# Altium footprint library PcbLib1.PcbLib: 1009 footprints (part 3 of 64)
Each footprint in its own frame and in the unit in brackets; x right, y up, seen from the top. Pads: shape width x height; smd on the part's side, far side on the other; paste and mask are expansions set on the pad; w line width, h text height; cw(c..) or ccw(c..) is an arc to the next point about the centre after c.
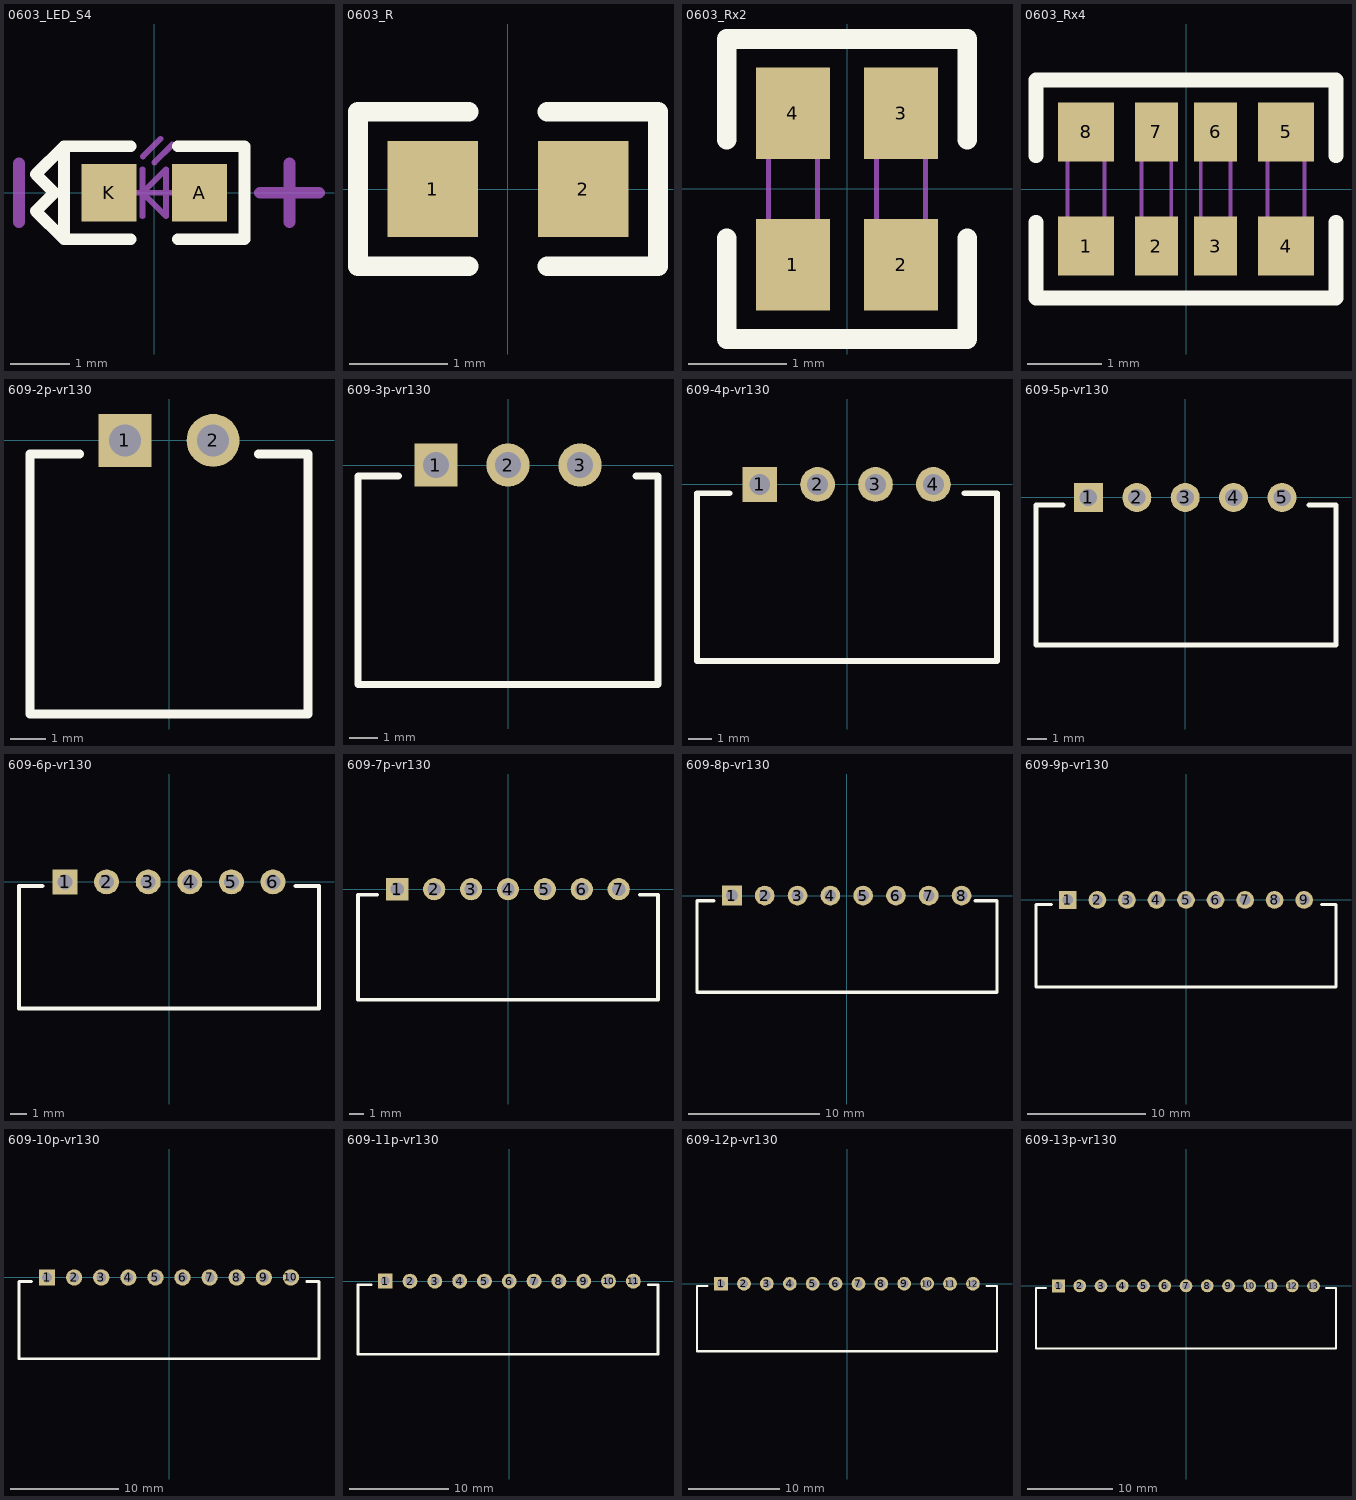
[diagram p2: the footprints below, top view; thin cyan lines are the x and y axes]

## 0603_LED_S4 [mm]
pads (2):
  rect 0.93x0.98 smd: A(0.77,0) K(-0.77,0)
Top Overlay:
  lines w0.2: -0.4,-0.79 -1.535,-0.79 ; -0.4,0.79 -1.535,0.79 ; 0.4,-0.79 1.535,-0.79 1.535,0.79 0.4,0.79 ; -1.535,-0.79 -2.012,-0.313 -1.7,0 -2.012,0.313 -1.535,0.79 ; -1.535,-0.79 -1.535,0.79
Mechanical 13:
  lines w0.1: -0.4,0 0.4,0 ; -0.2,-0.4 -0.2,0.4 ; -0.195,0.617 0.105,0.917 ; 0.005,0.517 0.305,0.817 ; -0.2,0 0.2,-0.4 0.2,0.4 -0.2,0
Mechanical 15:
  lines w0.203: -2.3,-0.5 -2.3,0.5 ; 1.8,0 2.8,0 ; 2.3,-0.5 2.3,0.5
3D body "User Library-LED_0603_R.STEP": height 0.6, standoff 0, extent -0.8,-0.4 0.8,0.4

## 0603_R [mm]
pads (2):
  rect 0.93x0.98 smd: 1(-0.77,0) 2(0.77,0)
Top Overlay:
  lines w0.2: -0.4,-0.79 -1.535,-0.79 -1.535,0.79 -0.4,0.79 ; 0.4,-0.79 1.535,-0.79 1.535,0.79 0.4,0.79
3D body "RES0603.STEP": height 0.45, standoff 0, extent -0.8,-0.41 0.8,0.41

## 0603_Rx2 [mm]
pads (4):
  rect 0.75x0.93 smd: 1(-0.55,-0.77) 2(0.55,-0.77) 3(0.55,0.77) 4(-0.55,0.77)
Top Overlay:
  lines w0.2: -1.225,-0.5 -1.225,-1.527 1.225,-1.527 1.225,-0.5 ; -1.225,0.5 -1.225,1.527 1.225,1.527 1.225,0.5
Mechanical 13:
  lines w0.05: -0.8,-0.8 -0.8,0.8 -0.3,0.8 -0.3,-0.8 -0.8,-0.8 ; 0.3,-0.8 0.3,0.8 0.8,0.8 0.8,-0.8 0.3,-0.8

## 0603_Rx4 [mm]
pads (8):
  rect 0.75x0.8 smd mask+0.051: 1(-1.35,-0.77) 4(1.35,-0.77) 5(1.35,0.77) 8(-1.35,0.77)
  rect 0.58x0.8 smd mask+0.051: 2(-0.4,-0.77) 3(0.4,-0.77) 6(0.4,0.77) 7(-0.4,0.77)
Top Overlay:
  lines w0.2: -2.025,-0.45 -2.025,-1.47 2.025,-1.47 2.025,-0.45 ; -2.025,0.45 -2.025,1.47 2.025,1.47 2.025,0.45
Mechanical 13:
  lines w0.05: -1.6,-0.8 -1.1,-0.8 -1.1,0.8 -1.6,0.8 -1.6,-0.8 ; -0.6,-0.8 -0.2,-0.8 -0.2,0.8 -0.6,0.8 -0.6,-0.8 ; 0.2,-0.8 0.6,-0.8 0.6,0.8 0.2,0.8 0.2,-0.8 ; 1.1,-0.8 1.6,-0.8 1.6,0.8 1.1,0.8 1.1,-0.8
3D body "8P4R-0603.STEP": height 0.6, standoff 0, extent -1.6,-0.775 1.6,0.825

## 609-2p-vr130 [mm]
height 11.7
pads (2):
  rect 1.5x1.5 hole 0.9: 1(-1.25,0)
  round 1.5 hole 0.9: 2(1.25,0)
Top Overlay:
  lines w0.254: -2.54,-0.381 -3.937,-0.381 -3.937,-7.747 3.937,-7.747 3.937,-0.381 2.54,-0.381
3D body "v150-090.stp": height 0.02, standoff -1.65, extent 0.5,-0.75 2,0.75
3D body "vf150-090.stp": height 0.01, standoff -1.65, extent -2,-0.75 -0.5,0.75
3D body "609-2p-vr130.stp": height 5.75, standoff -3.35, extent -3.75,-7.508 3.75,0.132

## 609-3p-vr130 [mm]
height 11.7
pads (3):
  rect 1.5x1.5 hole 0.9: 1(-2.5,0)
  round 1.5 hole 0.9: 2(0,0) 3(2.5,0)
Top Overlay:
  lines w0.254: -3.81,-0.381 -5.207,-0.381 -5.207,-7.62 5.207,-7.62 5.207,-0.381 4.445,-0.381
3D body "v150-090.stp": height 0.02, standoff -1.65, extent -0.75,-0.75 0.75,0.75
3D body "vf150-090.stp": height 0.01, standoff -1.65, extent -3.25,-0.75 -1.75,0.75
3D body "v150-090.stp": height 0.02, standoff -1.65, extent 1.75,-0.75 3.25,0.75
3D body "609-3p-vr130.stp": height 5.75, standoff -3.35, extent -5,-7.381 5,0.259

## 609-4p-vr130 [mm]
height 11.7
pads (4):
  rect 1.5x1.5 hole 0.9: 1(-3.77,0)
  round 1.5 hole 0.9: 2(-1.27,0) 3(1.23,0) 4(3.73,0)
Top Overlay:
  lines w0.254: -5.08,-0.381 -6.477,-0.381 -6.477,-7.62 6.477,-7.62 6.477,-0.381 5.08,-0.381
3D body "v150-090.stp": height 0.02, standoff -1.65, extent 0.48,-0.75 1.98,0.75
3D body "vf150-090.stp": height 0.01, standoff -1.65, extent -4.52,-0.75 -3.02,0.75
3D body "v150-090.stp": height 0.02, standoff -1.65, extent -2.02,-0.75 -0.52,0.75
3D body "v150-090.stp": height 0.02, standoff -1.65, extent 2.973,-0.75 4.473,0.75
3D body "609-4p-vr130.stp": height 5.75, standoff -3.35, extent -6.25,-7.381 6.25,0.259

## 609-5p-vr130 [mm]
height 11.7
pads (5):
  rect 1.5x1.5 hole 0.9: 1(-5,0)
  round 1.5 hole 0.9: 2(-2.5,0) 3(0,0) 4(2.5,0) 5(5,0)
Top Overlay:
  lines w0.254: -6.31,-0.381 -7.707,-0.381 -7.707,-7.62 7.787,-7.62 7.787,-0.381 6.39,-0.381
3D body "609-5p-vr130.stp": height 5.75, standoff -3.35, extent -7.46,-7.381 7.54,0.259
3D body "v150-090.stp": height 0.02, standoff -1.65, extent 4.25,-0.75 5.75,0.75
3D body "v150-090.stp": height 0.02, standoff -1.65, extent -0.75,-0.75 0.75,0.75
3D body "vf150-090.stp": height 0.01, standoff -1.65, extent -5.75,-0.75 -4.25,0.75
3D body "v150-090.stp": height 0.02, standoff -1.65, extent -3.25,-0.75 -1.75,0.75
3D body "v150-090.stp": height 0.02, standoff -1.65, extent 1.743,-0.75 3.243,0.75

## 609-6p-vr130 [mm]
height 11.7
pads (6):
  rect 1.5x1.5 hole 0.9: 1(-6.25,0)
  round 1.5 hole 0.9: 2(-3.75,0) 3(-1.25,0) 4(1.25,0) 5(3.75,0) 6(6.25,0)
Top Overlay:
  lines w0.254: -7.62,-0.254 -9.017,-0.254 -9.017,-7.62 9.017,-7.62 9.017,-0.254 7.62,-0.254
3D body "609-6p-vr130.stp": height 5.75, standoff -3.35, extent -8.75,-7.381 8.75,0.259
3D body "v150-090.stp": height 0.02, standoff -1.65, extent 5.5,-0.75 7,0.75
3D body "v150-090.stp": height 0.02, standoff -1.65, extent 0.493,-0.75 1.993,0.75
3D body "v150-090.stp": height 0.02, standoff -1.65, extent -4.5,-0.75 -3,0.75
3D body "vf150-090.stp": height 0.01, standoff -1.65, extent -7,-0.75 -5.5,0.75
3D body "v150-090.stp": height 0.02, standoff -1.65, extent -2,-0.75 -0.5,0.75
3D body "v150-090.stp": height 0.02, standoff -1.65, extent 3,-0.75 4.5,0.75

## 609-7p-vr130 [mm]
height 11.7
pads (7):
  rect 1.5x1.5 hole 0.9: 1(-7.5,0)
  round 1.5 hole 0.9: 2(-5,0) 3(-2.5,0) 4(0,0) 5(2.5,0) 6(5,0) 7(7.5,0)
Top Overlay:
  lines w0.254: -8.85,-0.381 -10.16,-0.381 -10.16,-7.493 10.16,-7.493 10.16,-0.381 8.93,-0.381
3D body "v150-090.stp": height 0.02, standoff -1.65, extent 6.75,-0.75 8.25,0.75
3D body "v150-090.stp": height 0.02, standoff -1.65, extent 1.75,-0.75 3.25,0.75
3D body "v150-090.stp": height 0.02, standoff -1.65, extent -3.25,-0.75 -1.75,0.75
3D body "vf150-090.stp": height 0.01, standoff -1.65, extent -8.25,-0.75 -6.75,0.75
3D body "v150-090.stp": height 0.02, standoff -1.65, extent -5.75,-0.75 -4.25,0.75
3D body "v150-090.stp": height 0.02, standoff -1.65, extent -0.757,-0.75 0.743,0.75
3D body "v150-090.stp": height 0.02, standoff -1.65, extent 4.25,-0.75 5.75,0.75
3D body "609-7p-vr130.stp": height 5.75, standoff -3.35, extent -10,-7.381 10,0.259

## 609-8p-vr130 [mm]
height 11.7
pads (8):
  rect 1.5x1.5 hole 0.9: 1(-8.75,0)
  round 1.5 hole 0.9: 2(-6.25,0) 3(-3.75,0) 4(-1.25,0) 5(1.25,0) 6(3.75,0) 7(6.25,0) 8(8.75,0)
Top Overlay:
  lines w0.254: -10.14,-0.381 -11.41,-0.381 -11.41,-7.366 11.45,-7.366 11.45,-0.381 9.799,-0.381
3D body "609-8p-vr130.stp": height 5.75, standoff -3.35, extent -11.23,-7.254 11.27,0.386
3D body "v150-090.stp": height 0.02, standoff -1.65, extent 8,-0.75 9.5,0.75
3D body "v150-090.stp": height 0.02, standoff -1.65, extent 3,-0.75 4.5,0.75
3D body "v150-090.stp": height 0.02, standoff -1.65, extent -2.007,-0.75 -0.507,0.75
3D body "v150-090.stp": height 0.02, standoff -1.65, extent -7,-0.75 -5.5,0.75
3D body "vf150-090.stp": height 0.01, standoff -1.65, extent -9.5,-0.75 -8,0.75
3D body "v150-090.stp": height 0.02, standoff -1.65, extent -4.5,-0.75 -3,0.75
3D body "v150-090.stp": height 0.02, standoff -1.65, extent 0.5,-0.75 2,0.75
3D body "v150-090.stp": height 0.02, standoff -1.65, extent 5.5,-0.75 7,0.75

## 609-9p-vr130 [mm]
height 11.7
pads (9):
  rect 1.5x1.5 hole 0.9: 1(-10,0)
  round 1.5 hole 0.9: 2(-7.5,0) 3(-5,0) 4(-2.5,0) 5(0,0) 6(2.5,0) 7(5,0) 8(7.5,0) 9(10,0)
Top Overlay:
  lines w0.254: -11.39,-0.381 -12.7,-0.381 -12.7,-7.366 12.7,-7.366 12.7,-0.381 11.47,-0.381
3D body "v150-090.stp": height 0.02, standoff -1.65, extent 4.25,-0.75 5.75,0.75
3D body "v150-090.stp": height 0.02, standoff -1.65, extent -0.75,-0.75 0.75,0.75
3D body "v150-090.stp": height 0.02, standoff -1.65, extent -5.75,-0.75 -4.25,0.75
3D body "vf150-090.stp": height 0.01, standoff -1.65, extent -10.75,-0.75 -9.25,0.75
3D body "v150-090.stp": height 0.02, standoff -1.65, extent -8.25,-0.75 -6.75,0.75
3D body "v150-090.stp": height 0.02, standoff -1.65, extent -3.257,-0.75 -1.757,0.75
3D body "v150-090.stp": height 0.02, standoff -1.65, extent 1.75,-0.75 3.25,0.75
3D body "v150-090.stp": height 0.02, standoff -1.65, extent 6.75,-0.75 8.25,0.75
3D body "v150-090.stp": height 0.02, standoff -1.65, extent 9.25,-0.75 10.75,0.75
3D body "609-9p-vr130.stp": height 5.75, standoff -3.35, extent -12.5,-7.254 12.5,0.386

## 609-10p-vr130 [mm]
height 11.7
pads (10):
  rect 1.5x1.5 hole 0.9: 1(-11.25,0)
  round 1.5 hole 0.9: 2(-8.75,0) 3(-6.25,0) 4(-3.75,0) 5(-1.25,0) 6(1.25,0) 7(3.75,0) 8(6.25,0) 9(8.75,0) 10(11.25,0)
Top Overlay:
  lines w0.254: -12.68,-0.381 -13.843,-0.381 -13.843,-7.493 13.843,-7.493 13.843,-0.381 12.72,-0.381
3D body "609-10p-vr130.stp": height 5.75, standoff -3.35, extent -13.73,-7.381 13.77,0.259
3D body "v150-090.stp": height 0.02, standoff -1.65, extent 10.5,-0.75 12,0.75
3D body "v150-090.stp": height 0.02, standoff -1.65, extent 8,-0.75 9.5,0.75
3D body "v150-090.stp": height 0.02, standoff -1.65, extent 5.5,-0.75 7,0.75
3D body "v150-090.stp": height 0.02, standoff -1.65, extent 0.5,-0.75 2,0.75
3D body "v150-090.stp": height 0.02, standoff -1.65, extent -4.507,-0.75 -3.007,0.75
3D body "v150-090.stp": height 0.02, standoff -1.65, extent -9.5,-0.75 -8,0.75
3D body "vf150-090.stp": height 0.01, standoff -1.65, extent -12,-0.75 -10.5,0.75
3D body "v150-090.stp": height 0.02, standoff -1.65, extent -7,-0.75 -5.5,0.75
3D body "v150-090.stp": height 0.02, standoff -1.65, extent -2,-0.75 -0.5,0.75
3D body "v150-090.stp": height 0.02, standoff -1.65, extent 3,-0.75 4.5,0.75

## 609-11p-vr130 [mm]
height 11.7
pads (11):
  rect 1.5x1.5 hole 0.9: 1(-12.5,0)
  round 1.5 hole 0.9: 2(-10,0) 3(-7.5,0) 4(-5,0) 5(-2.5,0) 6(0,0) 7(2.5,0) 8(5,0) 9(7.5,0) 10(10,0) 11(12.5,0)
Top Overlay:
  lines w0.254: -13.93,-0.381 -15.24,-0.381 -15.24,-7.366 14.986,-7.366 14.986,-0.381 14.01,-0.381
3D body "609-11p-vr130.stp": height 5.75, standoff -3.35, extent -15.127,-7.254 14.873,0.386
3D body "v150-090.stp": height 0.02, standoff -1.65, extent 1.75,-0.75 3.25,0.75
3D body "v150-090.stp": height 0.02, standoff -1.65, extent -3.25,-0.75 -1.75,0.75
3D body "v150-090.stp": height 0.02, standoff -1.65, extent -8.25,-0.75 -6.75,0.75
3D body "vf150-090.stp": height 0.01, standoff -1.65, extent -13.25,-0.75 -11.75,0.75
3D body "v150-090.stp": height 0.02, standoff -1.65, extent -10.75,-0.75 -9.25,0.75
3D body "v150-090.stp": height 0.02, standoff -1.65, extent -5.757,-0.75 -4.257,0.75
3D body "v150-090.stp": height 0.02, standoff -1.65, extent -0.75,-0.75 0.75,0.75
3D body "v150-090.stp": height 0.02, standoff -1.65, extent 4.25,-0.75 5.75,0.75
3D body "v150-090.stp": height 0.02, standoff -1.65, extent 6.75,-0.75 8.25,0.75
3D body "v150-090.stp": height 0.02, standoff -1.65, extent 9.25,-0.75 10.75,0.75
3D body "v150-090.stp": height 0.02, standoff -1.65, extent 11.75,-0.75 13.25,0.75

## 609-12p-vr130 [mm]
height 11.7
pads (12):
  rect 1.5x1.5 hole 0.9: 1(-13.75,0)
  round 1.5 hole 0.9: 2(-11.25,0) 3(-8.75,0) 4(-6.25,0) 5(-3.75,0) 6(-1.25,0) 7(1.25,0) 8(3.75,0) 9(6.25,0) 10(8.75,0) 11(11.25,0) 12(13.75,0)
Top Overlay:
  lines w0.254: -15.24,-0.254 -16.383,-0.254 -16.383,-7.366 16.383,-7.366 16.383,-0.254 15.24,-0.254
3D body "609-12p-vr130.stp": height 5.75, standoff -3.35, extent -16.25,-7.254 16.25,0.386
3D body "v150-090.stp": height 0.02, standoff -1.65, extent 13,-0.75 14.5,0.75
3D body "v150-090.stp": height 0.02, standoff -1.65, extent 10.5,-0.75 12,0.75
3D body "v150-090.stp": height 0.02, standoff -1.65, extent 8,-0.75 9.5,0.75
3D body "v150-090.stp": height 0.02, standoff -1.65, extent 5.5,-0.75 7,0.75
3D body "v150-090.stp": height 0.02, standoff -1.65, extent 3,-0.75 4.5,0.75
3D body "v150-090.stp": height 0.02, standoff -1.65, extent -2,-0.75 -0.5,0.75
3D body "v150-090.stp": height 0.02, standoff -1.65, extent -7.007,-0.75 -5.507,0.75
3D body "v150-090.stp": height 0.02, standoff -1.65, extent -12,-0.75 -10.5,0.75
3D body "vf150-090.stp": height 0.01, standoff -1.65, extent -14.5,-0.75 -13,0.75
3D body "v150-090.stp": height 0.02, standoff -1.65, extent -9.5,-0.75 -8,0.75
3D body "v150-090.stp": height 0.02, standoff -1.65, extent -4.5,-0.75 -3,0.75
3D body "v150-090.stp": height 0.02, standoff -1.65, extent 0.5,-0.75 2,0.75

## 609-13p-vr130 [mm]
height 11.7
pads (13):
  rect 1.5x1.5 hole 0.9: 1(-15,0)
  round 1.5 hole 0.9: 2(-12.5,0) 3(-10,0) 4(-7.5,0) 5(-5,0) 6(-2.5,0) 7(0,0) 8(2.5,0) 9(5,0) 10(7.5,0) 11(10,0) 12(12.5,0) 13(15,0)
Top Overlay:
  lines w0.254: -16.51,-0.254 -17.653,-0.254 -17.653,-7.366 17.653,-7.366 17.653,-0.254 16.51,-0.254
3D body "v150-090.stp": height 0.02, standoff -1.65, extent -0.75,-0.75 0.75,0.75
3D body "v150-090.stp": height 0.02, standoff -1.65, extent -5.75,-0.75 -4.25,0.75
3D body "v150-090.stp": height 0.02, standoff -1.65, extent -10.75,-0.75 -9.25,0.75
3D body "vf150-090.stp": height 0.01, standoff -1.65, extent -15.75,-0.75 -14.25,0.75
3D body "v150-090.stp": height 0.02, standoff -1.65, extent -13.25,-0.75 -11.75,0.75
3D body "v150-090.stp": height 0.02, standoff -1.65, extent -8.257,-0.75 -6.757,0.75
3D body "v150-090.stp": height 0.02, standoff -1.65, extent -3.25,-0.75 -1.75,0.75
3D body "v150-090.stp": height 0.02, standoff -1.65, extent 1.75,-0.75 3.25,0.75
3D body "v150-090.stp": height 0.02, standoff -1.65, extent 4.25,-0.75 5.75,0.75
3D body "v150-090.stp": height 0.02, standoff -1.65, extent 6.75,-0.75 8.25,0.75
3D body "v150-090.stp": height 0.02, standoff -1.65, extent 9.25,-0.75 10.75,0.75
3D body "v150-090.stp": height 0.02, standoff -1.65, extent 11.75,-0.75 13.25,0.75
3D body "v150-090.stp": height 0.02, standoff -1.65, extent 14.25,-0.75 15.75,0.75
3D body "609-13p-vr130.stp": height 5.75, standoff -3.35, extent -17.5,-7.254 17.5,0.386